# Altium schematic symbol library Regulator_Switching.SchLib: 1120 symbols (part 5 of 8)
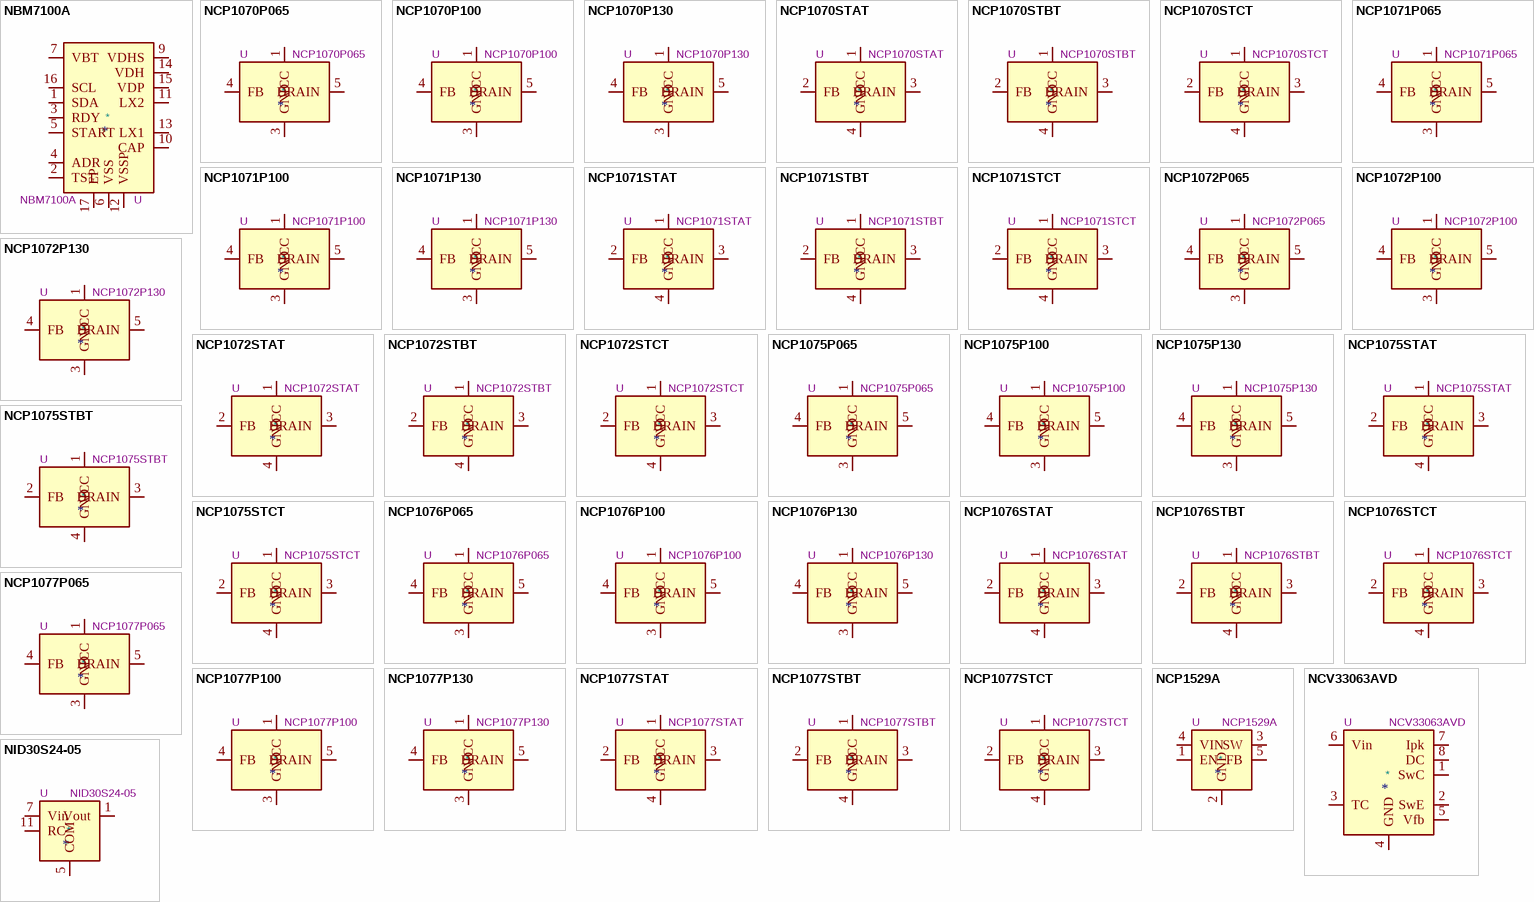
[diagram p31: symbols NBM7100A to NID30S24-05]

## NCP1071P100
designator *  value NCP1071P100  Reference: U
ki_keywords: SMPS Converter; ki_description: High-Voltage Switcher for Low Power Offline SMPS, 700V Vds, 14W/7.75W, 230V/85-265V, 100kHz, 22Ohm Rds(on), 350mA Ipk, DIP-7; ki_fp_filters: DIP*N7*W7.62mm*; Footprint: Package_DIP:DIP-8-N7_W7.62mm; Datasheet: http://www.onsemi.com/pub/Collateral/NCP1070-D.PDF
pins: 1 VCC, 2 NC hidden, 3 GND, 4 FB, 5 DRAIN, 7 GND hidden, 8 GND hidden

## NCP1071P130
designator *  value NCP1071P130  Reference: U
ki_keywords: SMPS Converter; ki_description: High-Voltage Switcher for Low Power Offline SMPS, 700V Vds, 14W/7.75W, 230V/85-265V, 130kHz, 22Ohm Rds(on), 350mA Ipk, DIP-7; ki_fp_filters: DIP*N7*W7.62mm*; Footprint: Package_DIP:DIP-8-N7_W7.62mm; Datasheet: http://www.onsemi.com/pub/Collateral/NCP1070-D.PDF
pins: 1 VCC, 2 NC hidden, 3 GND, 4 FB, 5 DRAIN, 7 GND hidden, 8 GND hidden

## NCP1071STAT
designator *  value NCP1071STAT  Reference: U
ki_keywords: SMPS Converter; ki_description: High-Voltage Switcher for Low Power Offline SMPS, 700V Vds, 14W/7.75W, 230V/85-265V, 65kHz, 22Ohm Rds(on), 350mA Ipk, SOT-223; ki_fp_filters: SOT?223*; Footprint: Package_TO_SOT_SMD:SOT-223; Datasheet: http://www.onsemi.com/pub/Collateral/NCP1070-D.PDF
pins: 1 VCC, 2 FB, 3 DRAIN, 4 GND

## NCP1071STBT
designator *  value NCP1071STBT  Reference: U
ki_keywords: SMPS Converter; ki_description: High-Voltage Switcher for Low Power Offline SMPS, 700V Vds, 14W/7.75W, 230V/85-265V, 100kHz, 22Ohm Rds(on), 350mA Ipk, SOT-223; ki_fp_filters: SOT?223*; Footprint: Package_TO_SOT_SMD:SOT-223; Datasheet: http://www.onsemi.com/pub/Collateral/NCP1070-D.PDF
pins: 1 VCC, 2 FB, 3 DRAIN, 4 GND

## NCP1071STCT
designator *  value NCP1071STCT  Reference: U
ki_keywords: SMPS Converter; ki_description: High-Voltage Switcher for Low Power Offline SMPS, 700V Vds, 14W/7.75W, 230V/85-265V, 130kHz, 22Ohm Rds(on), 350mA Ipk, SOT-223; ki_fp_filters: SOT?223*; Footprint: Package_TO_SOT_SMD:SOT-223; Datasheet: http://www.onsemi.com/pub/Collateral/NCP1070-D.PDF
pins: 1 VCC, 2 FB, 3 DRAIN, 4 GND

## NCP1072P065
designator *  value NCP1072P065  Reference: U
ki_keywords: SMPS Converter; ki_description: High-Voltage Switcher for Low Power Offline SMPS, 700V Vds, 19W/10W, 230V/85-265V, 65kHz, 11Ohm Rds(on), 250mA Ipk, DIP-7; ki_fp_filters: DIP*N7*W7.62mm*; Footprint: Package_DIP:DIP-8-N7_W7.62mm; Datasheet: http://www.onsemi.com/pub/Collateral/NCP1070-D.PDF
pins: 1 VCC, 2 NC hidden, 3 GND, 4 FB, 5 DRAIN, 7 GND hidden, 8 GND hidden

## NCP1072P100
designator *  value NCP1072P100  Reference: U
ki_keywords: SMPS Converter; ki_description: High-Voltage Switcher for Low Power Offline SMPS, 700V Vds, 19W/10W, 230V/85-265V, 100kHz, 11Ohm Rds(on), 250mA Ipk, DIP-7; ki_fp_filters: DIP*N7*W7.62mm*; Footprint: Package_DIP:DIP-8-N7_W7.62mm; Datasheet: http://www.onsemi.com/pub/Collateral/NCP1070-D.PDF
pins: 1 VCC, 2 NC hidden, 3 GND, 4 FB, 5 DRAIN, 7 GND hidden, 8 GND hidden

## NCP1072P130
designator *  value NCP1072P130  Reference: U
ki_keywords: SMPS Converter; ki_description: High-Voltage Switcher for Low Power Offline SMPS, 700V Vds, 19W/10W, 230V/85-265V, 130kHz, 11Ohm Rds(on), 250mA Ipk, DIP-7; ki_fp_filters: DIP*N7*W7.62mm*; Footprint: Package_DIP:DIP-8-N7_W7.62mm; Datasheet: http://www.onsemi.com/pub/Collateral/NCP1070-D.PDF
pins: 1 VCC, 2 NC hidden, 3 GND, 4 FB, 5 DRAIN, 7 GND hidden, 8 GND hidden

## NCP1072STAT
designator *  value NCP1072STAT  Reference: U
ki_keywords: SMPS Converter; ki_description: High-Voltage Switcher for Low Power Offline SMPS, 700V Vds, 19W/10W, 230V/85-265V, 65kHz, 11Ohm Rds(on), 250mA Ipk, SOT-223; ki_fp_filters: SOT?223*; Footprint: Package_TO_SOT_SMD:SOT-223; Datasheet: http://www.onsemi.com/pub/Collateral/NCP1070-D.PDF
pins: 1 VCC, 2 FB, 3 DRAIN, 4 GND

## NCP1072STBT
designator *  value NCP1072STBT  Reference: U
ki_keywords: SMPS Converter; ki_description: High-Voltage Switcher for Low Power Offline SMPS, 700V Vds, 19W/10W, 230V/85-265V, 100kHz, 11Ohm Rds(on), 250mA Ipk, SOT-223; ki_fp_filters: SOT?223*; Footprint: Package_TO_SOT_SMD:SOT-223; Datasheet: http://www.onsemi.com/pub/Collateral/NCP1070-D.PDF
pins: 1 VCC, 2 FB, 3 DRAIN, 4 GND

## NCP1072STCT
designator *  value NCP1072STCT  Reference: U
ki_keywords: SMPS Converter; ki_description: High-Voltage Switcher for Low Power Offline SMPS, 700V Vds, 19W/10W, 230V/85-265V, 130kHz, 11Ohm Rds(on), 250mA Ipk, SOT-223; ki_fp_filters: SOT?223*; Footprint: Package_TO_SOT_SMD:SOT-223; Datasheet: http://www.onsemi.com/pub/Collateral/NCP1070-D.PDF
pins: 1 VCC, 2 FB, 3 DRAIN, 4 GND

## NCP1075P065
designator *  value NCP1075P065  Reference: U
ki_keywords: SMPS Converter; ki_description: High-Voltage Switcher for Low Power Offline SMPS, 700V Vds, 19W/10W, 230V/85-265V, 65kHz, 11Ohm Rds(on), 450mA Ipk, DIP-7; ki_fp_filters: DIP*N7*W7.62mm*; Footprint: Package_DIP:DIP-8-N7_W7.62mm; Datasheet: http://www.onsemi.com/pub/Collateral/NCP1070-D.PDF
pins: 1 VCC, 2 NC hidden, 3 GND, 4 FB, 5 DRAIN, 7 GND hidden, 8 GND hidden

## NCP1075P100
designator *  value NCP1075P100  Reference: U
ki_keywords: SMPS Converter; ki_description: High-Voltage Switcher for Low Power Offline SMPS, 700V Vds, 19W/10W, 230V/85-265V, 100kHz, 11Ohm Rds(on), 450mA Ipk, DIP-7; ki_fp_filters: DIP*N7*W7.62mm*; Footprint: Package_DIP:DIP-8-N7_W7.62mm; Datasheet: http://www.onsemi.com/pub/Collateral/NCP1070-D.PDF
pins: 1 VCC, 2 NC hidden, 3 GND, 4 FB, 5 DRAIN, 7 GND hidden, 8 GND hidden

## NCP1075P130
designator *  value NCP1075P130  Reference: U
ki_keywords: SMPS Converter; ki_description: High-Voltage Switcher for Low Power Offline SMPS, 700V Vds, 19W/10W, 230V/85-265V, 130kHz, 11Ohm Rds(on), 450mA Ipk, DIP-7; ki_fp_filters: DIP*N7*W7.62mm*; Footprint: Package_DIP:DIP-8-N7_W7.62mm; Datasheet: http://www.onsemi.com/pub/Collateral/NCP1070-D.PDF
pins: 1 VCC, 2 NC hidden, 3 GND, 4 FB, 5 DRAIN, 7 GND hidden, 8 GND hidden

## NCP1075STAT
designator *  value NCP1075STAT  Reference: U
ki_keywords: SMPS Converter; ki_description: High-Voltage Switcher for Low Power Offline SMPS, 700V Vds, 19W/10W, 230V/85-265V, 65kHz, 11Ohm Rds(on), 450mA Ipk, SOT-223; ki_fp_filters: SOT?223*; Footprint: Package_TO_SOT_SMD:SOT-223; Datasheet: http://www.onsemi.com/pub/Collateral/NCP1070-D.PDF
pins: 1 VCC, 2 FB, 3 DRAIN, 4 GND

## NCP1075STBT
designator *  value NCP1075STBT  Reference: U
ki_keywords: SMPS Converter; ki_description: High-Voltage Switcher for Low Power Offline SMPS, 700V Vds, 19W/10W, 230V/85-265V, 100kHz, 11Ohm Rds(on), 450mA Ipk, SOT-223; ki_fp_filters: SOT?223*; Footprint: Package_TO_SOT_SMD:SOT-223; Datasheet: http://www.onsemi.com/pub/Collateral/NCP1070-D.PDF
pins: 1 VCC, 2 FB, 3 DRAIN, 4 GND

## NCP1075STCT
designator *  value NCP1075STCT  Reference: U
ki_keywords: SMPS Converter; ki_description: High-Voltage Switcher for Low Power Offline SMPS, 700V Vds, 19W/10W, 230V/85-265V, 130kHz, 11Ohm Rds(on), 450mA Ipk, SOT-223; ki_fp_filters: SOT?223*; Footprint: Package_TO_SOT_SMD:SOT-223; Datasheet: http://www.onsemi.com/pub/Collateral/NCP1070-D.PDF
pins: 1 VCC, 2 FB, 3 DRAIN, 4 GND

## NCP1076P065
designator *  value NCP1076P065  Reference: U
ki_keywords: SMPS Converter; ki_description: High-Voltage Switcher for Low Power Offline SMPS, 700V Vds, 25W/15W, 230V/85-265V, 65kHz, 4.7Ohm Rds(on), 650mA Ipk, DIP-7; ki_fp_filters: DIP*N7*W7.62mm*; Footprint: Package_DIP:DIP-8-N7_W7.62mm; Datasheet: http://www.onsemi.com/pub/Collateral/NCP1070-D.PDF
pins: 1 VCC, 2 NC hidden, 3 GND, 4 FB, 5 DRAIN, 7 GND hidden, 8 GND hidden

## NCP1076P100
designator *  value NCP1076P100  Reference: U
ki_keywords: SMPS Converter; ki_description: High-Voltage Switcher for Low Power Offline SMPS, 700V Vds, 25W/15W, 230V/85-265V, 100kHz, 4.7Ohm Rds(on), 650mA Ipk, DIP-7; ki_fp_filters: DIP*N7*W7.62mm*; Footprint: Package_DIP:DIP-8-N7_W7.62mm; Datasheet: http://www.onsemi.com/pub/Collateral/NCP1070-D.PDF
pins: 1 VCC, 2 NC hidden, 3 GND, 4 FB, 5 DRAIN, 7 GND hidden, 8 GND hidden

## NCP1076P130
designator *  value NCP1076P130  Reference: U
ki_keywords: SMPS Converter; ki_description: High-Voltage Switcher for Low Power Offline SMPS, 700V Vds, 25W/15W, 230V/85-265V, 130kHz, 4.7Ohm Rds(on), 650mA Ipk, DIP-7; ki_fp_filters: DIP*N7*W7.62mm*; Footprint: Package_DIP:DIP-8-N7_W7.62mm; Datasheet: http://www.onsemi.com/pub/Collateral/NCP1070-D.PDF
pins: 1 VCC, 2 NC hidden, 3 GND, 4 FB, 5 DRAIN, 7 GND hidden, 8 GND hidden

## NCP1076STAT
designator *  value NCP1076STAT  Reference: U
ki_keywords: SMPS Converter; ki_description: High-Voltage Switcher for Low Power Offline SMPS, 700V Vds, 25W/15W, 230V/85-265V, 65kHz, 4.7Ohm Rds(on), 650mA Ipk, SOT-223; ki_fp_filters: SOT?223*; Footprint: Package_TO_SOT_SMD:SOT-223; Datasheet: http://www.onsemi.com/pub/Collateral/NCP1070-D.PDF
pins: 1 VCC, 2 FB, 3 DRAIN, 4 GND

## NCP1076STBT
designator *  value NCP1076STBT  Reference: U
ki_keywords: SMPS Converter; ki_description: High-Voltage Switcher for Low Power Offline SMPS, 700V Vds, 25W/15W, 230V/85-265V, 100kHz, 4.7Ohm Rds(on), 650mA Ipk, SOT-223; ki_fp_filters: SOT?223*; Footprint: Package_TO_SOT_SMD:SOT-223; Datasheet: http://www.onsemi.com/pub/Collateral/NCP1070-D.PDF
pins: 1 VCC, 2 FB, 3 DRAIN, 4 GND

## NCP1076STCT
designator *  value NCP1076STCT  Reference: U
ki_keywords: SMPS Converter; ki_description: High-Voltage Switcher for Low Power Offline SMPS, 700V Vds, 25W/15W, 230V/85-265V, 130kHz, 4.7Ohm Rds(on), 650mA Ipk, SOT-223; ki_fp_filters: SOT?223*; Footprint: Package_TO_SOT_SMD:SOT-223; Datasheet: http://www.onsemi.com/pub/Collateral/NCP1070-D.PDF
pins: 1 VCC, 2 FB, 3 DRAIN, 4 GND

## NCP1077P065
designator *  value NCP1077P065  Reference: U
ki_keywords: SMPS Converter; ki_description: High-Voltage Switcher for Low Power Offline SMPS, 700V Vds, 25W/15W, 230V/85-265V, 65kHz, 4.7Ohm Rds(on), 800mA Ipk, DIP-7; ki_fp_filters: DIP*N7*W7.62mm*; Footprint: Package_DIP:DIP-8-N7_W7.62mm; Datasheet: http://www.onsemi.com/pub/Collateral/NCP1070-D.PDF
pins: 1 VCC, 2 NC hidden, 3 GND, 4 FB, 5 DRAIN, 7 GND hidden, 8 GND hidden

## NCP1077P100
designator *  value NCP1077P100  Reference: U
ki_keywords: SMPS Converter; ki_description: High-Voltage Switcher for Low Power Offline SMPS, 700V Vds, 25W/15W, 230V/85-265V, 100kHz, 4.7Ohm Rds(on), 800mA Ipk, DIP-7; ki_fp_filters: DIP*N7*W7.62mm*; Footprint: Package_DIP:DIP-8-N7_W7.62mm; Datasheet: http://www.onsemi.com/pub/Collateral/NCP1070-D.PDF
pins: 1 VCC, 2 NC hidden, 3 GND, 4 FB, 5 DRAIN, 7 GND hidden, 8 GND hidden

## NCP1077P130
designator *  value NCP1077P130  Reference: U
ki_keywords: SMPS Converter; ki_description: High-Voltage Switcher for Low Power Offline SMPS, 700V Vds, 25W/15W, 230V/85-265V, 130kHz, 4.7Ohm Rds(on), 800mA Ipk, DIP-7; ki_fp_filters: DIP*N7*W7.62mm*; Footprint: Package_DIP:DIP-8-N7_W7.62mm; Datasheet: http://www.onsemi.com/pub/Collateral/NCP1070-D.PDF
pins: 1 VCC, 2 NC hidden, 3 GND, 4 FB, 5 DRAIN, 7 GND hidden, 8 GND hidden

## NCP1077STAT
designator *  value NCP1077STAT  Reference: U
ki_keywords: SMPS Converter; ki_description: High-Voltage Switcher for Low Power Offline SMPS, 700V Vds, 25W/15W, 230V/85-265V, 65kHz, 4.7Ohm Rds(on), 800mA Ipk, SOT-223; ki_fp_filters: SOT?223*; Footprint: Package_TO_SOT_SMD:SOT-223; Datasheet: http://www.onsemi.com/pub/Collateral/NCP1070-D.PDF
pins: 1 VCC, 2 FB, 3 DRAIN, 4 GND

## NCP1077STBT
designator *  value NCP1077STBT  Reference: U
ki_keywords: SMPS Converter; ki_description: High-Voltage Switcher for Low Power Offline SMPS, 700V Vds, 25W/15W, 230V/85-265V, 100kHz, 4.7Ohm Rds(on), 800mA Ipk, SOT-223; ki_fp_filters: SOT?223*; Footprint: Package_TO_SOT_SMD:SOT-223; Datasheet: http://www.onsemi.com/pub/Collateral/NCP1070-D.PDF
pins: 1 VCC, 2 FB, 3 DRAIN, 4 GND

## NCP1077STCT
designator *  value NCP1077STCT  Reference: U
ki_keywords: SMPS Converter; ki_description: High-Voltage Switcher for Low Power Offline SMPS, 700V Vds, 25W/15W, 230V/85-265V, 130kHz, 4.7Ohm Rds(on), 800mA Ipk, SOT-223; ki_fp_filters: SOT?223*; Footprint: Package_TO_SOT_SMD:SOT-223; Datasheet: http://www.onsemi.com/pub/Collateral/NCP1070-D.PDF
pins: 1 VCC, 2 FB, 3 DRAIN, 4 GND

## NCP1529A
designator *  value NCP1529A  Reference: U
ki_keywords: Step-Down Buck DC-DC Regulator Adjustable; ki_description: 1.7MHz, 1A, High Efficiency, Low Ripple, Adjustable Output Voltage Step-down Converter, SOT-23-5; ki_fp_filters: SOT?23*; Footprint: Package_TO_SOT_SMD:SOT-23-5; Datasheet: https://www.onsemi.com/pub/Collateral/NCP1529-D.PDF
pins: 1 EN, 2 GND, 3 SW, 4 VIN, 5 FB

## NCV33063AVD
designator *  value NCV33063AVD  Reference: U
ki_keywords: smps buck boost inverting; ki_description: 1.5A, step-up/down/inverting switching regulator, 3-40V Vin, 100kHz, SO-8; ki_fp_filters: SOIC*3.9x4.9mm*P1.27mm*; Footprint: Package_SO:SOIC-8_3.9x4.9mm_P1.27mm; Datasheet: http://www.onsemi.com/pub_link/Collateral/MC34063A-D.PDF
pins: 1 SwC, 2 SwE, 3 TC, 4 GND, 5 Vfb, 6 Vin, 7 Ipk, 8 DC

## NID30S24-05
designator *  value NID30S24-05  Reference: U
ki_keywords: Step-Down Converter Module DC/DC; ki_description: 2.5A/12.5W Step Down Converter Module, fixed 5V Output Voltage, 250kHz, 20-53V Input Voltage; ki_fp_filters: Converter*DCDC*MeanWell*NID30*THT*; Footprint: Converter_DCDC:Converter_DCDC_MeanWell_NID30_THT; Datasheet: http://www.meanwell.com/webapp/product/search.aspx?prod=nid30
pins: 1 Vout, 2 Vout hidden, 3 Vout hidden, 4 Vout hidden, 5 COM, 6 COM hidden, 7 Vin, 8 Vin hidden, 9 NC hidden, 10 NC hidden, 11 RC

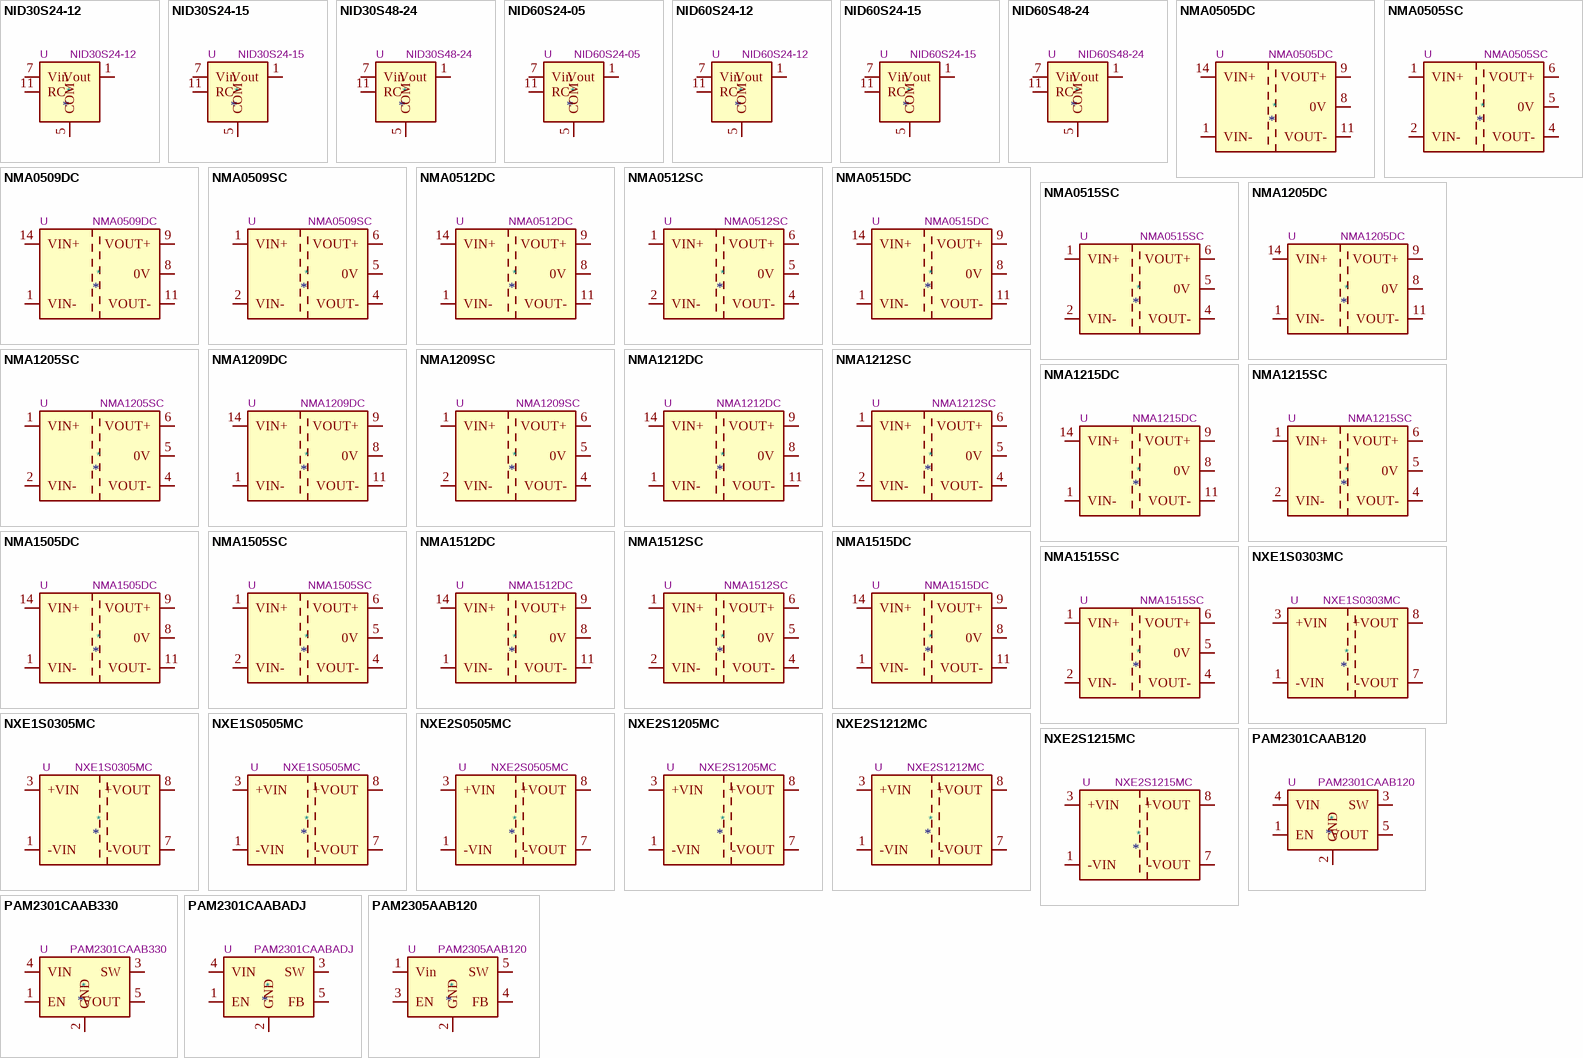
[diagram p16: symbols NID30S24-12 to PAM2305AAB120]

## NID30S24-12
designator *  value NID30S24-12  Reference: U
ki_keywords: Step-Down Converter Module DC/DC; ki_description: 2.5A/30W Step Down Converter Module, fixed 12V Output Voltage, 250kHz, 20-53V Input Voltage; ki_fp_filters: Converter*DCDC*MeanWell*NID30*THT*; Footprint: Converter_DCDC:Converter_DCDC_MeanWell_NID30_THT; Datasheet: http://www.meanwell.com/webapp/product/search.aspx?prod=nid30
pins: 1 Vout, 2 Vout hidden, 3 Vout hidden, 4 Vout hidden, 5 COM, 6 COM hidden, 7 Vin, 8 Vin hidden, 9 NC hidden, 10 NC hidden, 11 RC

## NID30S24-15
designator *  value NID30S24-15  Reference: U
ki_keywords: Step-Down Converter Module DC/DC; ki_description: 2.5A/30W Step Down Converter Module, fixed 15V Output Voltage, 250kHz, 20-53V Input Voltage; ki_fp_filters: Converter*DCDC*MeanWell*NID30*THT*; Footprint: Converter_DCDC:Converter_DCDC_MeanWell_NID30_THT; Datasheet: http://www.meanwell.com/webapp/product/search.aspx?prod=nid30
pins: 1 Vout, 2 Vout hidden, 3 Vout hidden, 4 Vout hidden, 5 COM, 6 COM hidden, 7 Vin, 8 Vin hidden, 9 NC hidden, 10 NC hidden, 11 RC

## NID30S48-24
designator *  value NID30S48-24  Reference: U
ki_keywords: Step-Down Converter Module DC/DC; ki_description: 1.25A/30W Step Down Converter Module, fixed 24V Output Voltage, 250kHz, 30-53V Input Voltage; ki_fp_filters: Converter*DCDC*MeanWell*NID30*THT*; Footprint: Converter_DCDC:Converter_DCDC_MeanWell_NID30_THT; Datasheet: http://www.meanwell.com/webapp/product/search.aspx?prod=nid30
pins: 1 Vout, 2 Vout hidden, 3 Vout hidden, 4 Vout hidden, 5 COM, 6 COM hidden, 7 Vin, 8 Vin hidden, 9 NC hidden, 10 NC hidden, 11 RC

## NID60S24-05
designator *  value NID60S24-05  Reference: U
ki_keywords: Step-Down Converter Module DC/DC; ki_description: 4A/20W Step Down Converter Module, fixed 5V Output Voltage, 250kHz, 20-53V Input Voltage; ki_fp_filters: Converter*DCDC*MeanWell*NID60*; Footprint: Converter_DCDC:Converter_DCDC_MeanWell_NID60_THT; Datasheet: http://www.meanwell.com/78ddf876-a86c-4a52-8a41-4ee24dd9913d
pins: 1 Vout, 2 Vout hidden, 3 Vout hidden, 4 Vout hidden, 5 COM, 6 COM hidden, 7 Vin, 8 Vin hidden, 9 NC hidden, 10 NC hidden, 11 RC

## NID60S24-12
designator *  value NID60S24-12  Reference: U
ki_keywords: Step-Down Converter Module DC/DC; ki_description: 4A/48W Step Down Converter Module, fixed 12V Output Voltage, 250kHz, 20-53V Input Voltage; ki_fp_filters: Converter*DCDC*MeanWell*NID60*; Footprint: Converter_DCDC:Converter_DCDC_MeanWell_NID60_THT; Datasheet: http://www.meanwell.com/78ddf876-a86c-4a52-8a41-4ee24dd9913d
pins: 1 Vout, 2 Vout hidden, 3 Vout hidden, 4 Vout hidden, 5 COM, 6 COM hidden, 7 Vin, 8 Vin hidden, 9 NC hidden, 10 NC hidden, 11 RC

## NID60S24-15
designator *  value NID60S24-15  Reference: U
ki_keywords: Step-Down Converter Module DC/DC; ki_description: 4A/60W Step Down Converter Module, fixed 15V Output Voltage, 250kHz, 20-53V Input Voltage; ki_fp_filters: Converter*DCDC*MeanWell*NID60*; Footprint: Converter_DCDC:Converter_DCDC_MeanWell_NID60_THT; Datasheet: http://www.meanwell.com/78ddf876-a86c-4a52-8a41-4ee24dd9913d
pins: 1 Vout, 2 Vout hidden, 3 Vout hidden, 4 Vout hidden, 5 COM, 6 COM hidden, 7 Vin, 8 Vin hidden, 9 NC hidden, 10 NC hidden, 11 RC

## NID60S48-24
designator *  value NID60S48-24  Reference: U
ki_keywords: Step-Down Converter Module DC/DC; ki_description: 2.5A/60W Step Down Converter Module, fixed 24V Output Voltage, 250kHz, 30-53V Input Voltage; ki_fp_filters: Converter*DCDC*MeanWell*NID60*; Footprint: Converter_DCDC:Converter_DCDC_MeanWell_NID60_THT; Datasheet: http://www.meanwell.com/78ddf876-a86c-4a52-8a41-4ee24dd9913d
pins: 1 Vout, 2 Vout hidden, 3 Vout hidden, 4 Vout hidden, 5 COM, 6 COM hidden, 7 Vin, 8 Vin hidden, 9 NC hidden, 10 NC hidden, 11 RC

## NMA0505DC
designator *  value NMA0505DC  Reference: U
ki_keywords: Murata isolated isolation dc-dc converter; ki_description: +/-100mA Isolated 1W Dual output DC/DC Converter, 5V Input Voltage, +/-5V Output Voltage, DIP Package; ki_fp_filters: Converter*DCDC*Murata*NMAxxxxDC*; Footprint: Converter_DCDC:Converter_DCDC_Murata_NMAxxxxDC_THT; Datasheet: http://power.murata.com/data/power/ncl/kdc_nma.pdf
pins: 1 VIN-, 7 NC hidden, 8 0V, 9 VOUT+, 11 VOUT-, 14 VIN+

## NMA0505SC
designator *  value NMA0505SC  Reference: U
ki_keywords: Murata isolated isolation dc-dc converter; ki_description: +/-100mA Isolated 1W Dual output DC/DC Converter Module, 5V Input Voltage, +/-5V Output Voltage, SIP3; ki_fp_filters: Converter*DCDC*Murata*NMAxxxxSC*; Footprint: Converter_DCDC:Converter_DCDC_Murata_NMAxxxxSC_THT; Datasheet: http://power.murata.com/data/power/ncl/kdc_nma.pdf
pins: 1 VIN+, 2 VIN-, 4 VOUT-, 5 0V, 6 VOUT+

## NMA0509DC
designator *  value NMA0509DC  Reference: U
ki_keywords: Murata isolated isolation dc-dc converter; ki_description: +/-55mA Isolated 1W Dual output DC/DC Converter Module, 5V Input Voltage, +/-9V Output Voltage, DIP Package; ki_fp_filters: Converter*DCDC*Murata*NMAxxxxDC*; Footprint: Converter_DCDC:Converter_DCDC_Murata_NMAxxxxDC_THT; Datasheet: http://power.murata.com/data/power/ncl/kdc_nma.pdf
pins: 1 VIN-, 7 NC hidden, 8 0V, 9 VOUT+, 11 VOUT-, 14 VIN+

## NMA0509SC
designator *  value NMA0509SC  Reference: U
ki_keywords: Murata isolated isolation dc-dc converter; ki_description: +/-55mA Isolated 1W Dual output DC/DC Converter Module, 5V Input Voltage, +/-9V Output Voltage, SIP3; ki_fp_filters: Converter*DCDC*Murata*NMAxxxxSC*; Footprint: Converter_DCDC:Converter_DCDC_Murata_NMAxxxxSC_THT; Datasheet: http://power.murata.com/data/power/ncl/kdc_nma.pdf
pins: 1 VIN+, 2 VIN-, 4 VOUT-, 5 0V, 6 VOUT+

## NMA0512DC
designator *  value NMA0512DC  Reference: U
ki_keywords: Murata isolated isolation dc-dc converter; ki_description: +/-42mA Isolated 1W Dual output DC/DC Converter Module, 5V Input Voltage, +/-12V Output Voltage, DIP Package; ki_fp_filters: Converter*DCDC*Murata*NMAxxxxDC*; Footprint: Converter_DCDC:Converter_DCDC_Murata_NMAxxxxDC_THT; Datasheet: http://power.murata.com/data/power/ncl/kdc_nma.pdf
pins: 1 VIN-, 7 NC hidden, 8 0V, 9 VOUT+, 11 VOUT-, 14 VIN+

## NMA0512SC
designator *  value NMA0512SC  Reference: U
ki_keywords: Murata isolated isolation dc-dc converter; ki_description: +/-42mA Isolated 1W Dual output DC/DC Converter Module, 5V Input Voltage, +/-12V Output Voltage, SIP3; ki_fp_filters: Converter*DCDC*Murata*NMAxxxxSC*; Footprint: Converter_DCDC:Converter_DCDC_Murata_NMAxxxxSC_THT; Datasheet: http://power.murata.com/data/power/ncl/kdc_nma.pdf
pins: 1 VIN+, 2 VIN-, 4 VOUT-, 5 0V, 6 VOUT+

## NMA0515DC
designator *  value NMA0515DC  Reference: U
ki_keywords: Murata isolated isolation dc-dc converter; ki_description: +/-33mA Isolated 1W Dual output DC/DC Converter Module, 5V Input Voltage, +/-15V Output Voltage, DIP Package; ki_fp_filters: Converter*DCDC*Murata*NMAxxxxDC*; Footprint: Converter_DCDC:Converter_DCDC_Murata_NMAxxxxDC_THT; Datasheet: http://power.murata.com/data/power/ncl/kdc_nma.pdf
pins: 1 VIN-, 7 NC hidden, 8 0V, 9 VOUT+, 11 VOUT-, 14 VIN+

## NMA0515SC
designator *  value NMA0515SC  Reference: U
ki_keywords: Murata isolated isolation dc-dc converter; ki_description: +/-33mA Isolated 1W Dual output DC/DC Converter Module, 5V Input Voltage, +/-15V Output Voltage, SIP3; ki_fp_filters: Converter*DCDC*Murata*NMAxxxxSC*; Footprint: Converter_DCDC:Converter_DCDC_Murata_NMAxxxxSC_THT; Datasheet: http://power.murata.com/data/power/ncl/kdc_nma.pdf
pins: 1 VIN+, 2 VIN-, 4 VOUT-, 5 0V, 6 VOUT+

## NMA1205DC
designator *  value NMA1205DC  Reference: U
ki_keywords: Murata isolated isolation dc-dc converter; ki_description: +/-100mA Isolated 1W Dual output DC/DC Converter Module, 12V Input Voltage, +/-5V Output Voltage, DIP Package; ki_fp_filters: Converter*DCDC*Murata*NMAxxxxDC*; Footprint: Converter_DCDC:Converter_DCDC_Murata_NMAxxxxDC_THT; Datasheet: http://power.murata.com/data/power/ncl/kdc_nma.pdf
pins: 1 VIN-, 7 NC hidden, 8 0V, 9 VOUT+, 11 VOUT-, 14 VIN+

## NMA1205SC
designator *  value NMA1205SC  Reference: U
ki_keywords: Murata isolated isolation dc-dc converter; ki_description: +/-100mA Isolated 1W Dual output DC/DC Converter Module, 12V Input Voltage, +/-5V Output Voltage, SIP3; ki_fp_filters: Converter*DCDC*Murata*NMAxxxxSC*; Footprint: Converter_DCDC:Converter_DCDC_Murata_NMAxxxxSC_THT; Datasheet: http://power.murata.com/data/power/ncl/kdc_nma.pdf
pins: 1 VIN+, 2 VIN-, 4 VOUT-, 5 0V, 6 VOUT+

## NMA1209DC
designator *  value NMA1209DC  Reference: U
ki_keywords: Murata isolated isolation dc-dc converter; ki_description: +/-55mA Isolated 1W Dual output DC/DC Converter Module, 12V Input Voltage, +/-9V Output Voltage, DIP Package; ki_fp_filters: Converter*DCDC*Murata*NMAxxxxDC*; Footprint: Converter_DCDC:Converter_DCDC_Murata_NMAxxxxDC_THT; Datasheet: http://power.murata.com/data/power/ncl/kdc_nma.pdf
pins: 1 VIN-, 7 NC hidden, 8 0V, 9 VOUT+, 11 VOUT-, 14 VIN+

## NMA1209SC
designator *  value NMA1209SC  Reference: U
ki_keywords: Murata isolated isolation dc-dc converter; ki_description: +/-55mA Isolated 1W Dual output DC/DC Converter Module, 12V Input Voltage, +/-9V Output Voltage, SIP3; ki_fp_filters: Converter*DCDC*Murata*NMAxxxxSC*; Footprint: Converter_DCDC:Converter_DCDC_Murata_NMAxxxxSC_THT; Datasheet: http://power.murata.com/data/power/ncl/kdc_nma.pdf
pins: 1 VIN+, 2 VIN-, 4 VOUT-, 5 0V, 6 VOUT+

## NMA1212DC
designator *  value NMA1212DC  Reference: U
ki_keywords: Murata isolated isolation dc-dc converter; ki_description: +/-42mA Isolated 1W Dual output DC/DC Converter Module, 12V Input Voltage, +/-12V Output Voltage, DIP Package; ki_fp_filters: Converter*DCDC*Murata*NMAxxxxDC*; Footprint: Converter_DCDC:Converter_DCDC_Murata_NMAxxxxDC_THT; Datasheet: http://power.murata.com/data/power/ncl/kdc_nma.pdf
pins: 1 VIN-, 7 NC hidden, 8 0V, 9 VOUT+, 11 VOUT-, 14 VIN+

## NMA1212SC
designator *  value NMA1212SC  Reference: U
ki_keywords: Murata isolated isolation dc-dc converter; ki_description: +/-42mA Isolated 1W Dual output DC/DC Converter Module, 12V Input Voltage, +/-12V Output Voltage, SIP3; ki_fp_filters: Converter*DCDC*Murata*NMAxxxxSC*; Footprint: Converter_DCDC:Converter_DCDC_Murata_NMAxxxxSC_THT; Datasheet: http://power.murata.com/data/power/ncl/kdc_nma.pdf
pins: 1 VIN+, 2 VIN-, 4 VOUT-, 5 0V, 6 VOUT+

## NMA1215DC
designator *  value NMA1215DC  Reference: U
ki_keywords: Murata isolated isolation dc-dc converter; ki_description: +/-33mA Isolated 1W Dual output DC/DC Converter Module, 12V Input Voltage, +/-15V Output Voltage, DIP Package; ki_fp_filters: Converter*DCDC*Murata*NMAxxxxDC*; Footprint: Converter_DCDC:Converter_DCDC_Murata_NMAxxxxDC_THT; Datasheet: http://power.murata.com/data/power/ncl/kdc_nma.pdf
pins: 1 VIN-, 7 NC hidden, 8 0V, 9 VOUT+, 11 VOUT-, 14 VIN+

## NMA1215SC
designator *  value NMA1215SC  Reference: U
ki_keywords: Murata isolated isolation dc-dc converter; ki_description: +/-33mA Isolated 1W Dual output DC/DC Converter Module, 12V Input Voltage, +/-15V Output Voltage, SIP3; ki_fp_filters: Converter*DCDC*Murata*NMAxxxxSC*; Footprint: Converter_DCDC:Converter_DCDC_Murata_NMAxxxxSC_THT; Datasheet: http://power.murata.com/data/power/ncl/kdc_nma.pdf
pins: 1 VIN+, 2 VIN-, 4 VOUT-, 5 0V, 6 VOUT+

## NMA1505DC
designator *  value NMA1505DC  Reference: U
ki_keywords: Murata isolated isolation dc-dc converter; ki_description: +/-100mA Isolated 1W Dual output DC/DC Converter Module, 15V Input Voltage, +/-5V Output Voltage, DIP Package; ki_fp_filters: Converter*DCDC*Murata*NMAxxxxDC*; Footprint: Converter_DCDC:Converter_DCDC_Murata_NMAxxxxDC_THT; Datasheet: http://power.murata.com/data/power/ncl/kdc_nma.pdf
pins: 1 VIN-, 7 NC hidden, 8 0V, 9 VOUT+, 11 VOUT-, 14 VIN+

## NMA1505SC
designator *  value NMA1505SC  Reference: U
ki_keywords: Murata isolated isolation dc-dc converter; ki_description: +/-100mA Isolated 1W Dual output DC/DC Converter Module, 15V Input Voltage, +/-5V Output Voltage, SIP3; ki_fp_filters: Converter*DCDC*Murata*NMAxxxxSC*; Footprint: Converter_DCDC:Converter_DCDC_Murata_NMAxxxxSC_THT; Datasheet: http://power.murata.com/data/power/ncl/kdc_nma.pdf
pins: 1 VIN+, 2 VIN-, 4 VOUT-, 5 0V, 6 VOUT+

## NMA1512DC
designator *  value NMA1512DC  Reference: U
ki_keywords: Murata isolated isolation dc-dc converter; ki_description: +/-42mA Isolated 1W Dual output DC/DC Converter Module, 15V Input Voltage, +/-12V Output Voltage, DIP Package; ki_fp_filters: Converter*DCDC*Murata*NMAxxxxDC*; Footprint: Converter_DCDC:Converter_DCDC_Murata_NMAxxxxDC_THT; Datasheet: http://power.murata.com/data/power/ncl/kdc_nma.pdf
pins: 1 VIN-, 7 NC hidden, 8 0V, 9 VOUT+, 11 VOUT-, 14 VIN+

## NMA1512SC
designator *  value NMA1512SC  Reference: U
ki_keywords: Murata isolated isolation dc-dc converter; ki_description: +/-42mA Isolated 1W Dual output DC/DC Converter Module, 15V Input Voltage, +/-12V Output Voltage, SIP3; ki_fp_filters: Converter*DCDC*Murata*NMAxxxxSC*; Footprint: Converter_DCDC:Converter_DCDC_Murata_NMAxxxxSC_THT; Datasheet: http://power.murata.com/data/power/ncl/kdc_nma.pdf
pins: 1 VIN+, 2 VIN-, 4 VOUT-, 5 0V, 6 VOUT+

## NMA1515DC
designator *  value NMA1515DC  Reference: U
ki_keywords: Murata isolated isolation dc-dc converter; ki_description: +/-33mA Isolated 1W Dual output DC/DC Converter Module, 5V Input Voltage, +/-15V Output Voltage, DIP Package; ki_fp_filters: Converter*DCDC*Murata*NMAxxxxDC*; Footprint: Converter_DCDC:Converter_DCDC_Murata_NMAxxxxDC_THT; Datasheet: http://power.murata.com/data/power/ncl/kdc_nma.pdf
pins: 1 VIN-, 7 NC hidden, 8 0V, 9 VOUT+, 11 VOUT-, 14 VIN+

## NMA1515SC
designator *  value NMA1515SC  Reference: U
ki_keywords: Murata isolated isolation dc-dc converter; ki_description: +/-33mA Isolated 1W Dual output DC/DC Converter Module, 5V Input Voltage, +/-15V Output Voltage, SIP3; ki_fp_filters: Converter*DCDC*Murata*NMAxxxxSC*; Footprint: Converter_DCDC:Converter_DCDC_Murata_NMAxxxxSC_THT; Datasheet: http://power.murata.com/data/power/ncl/kdc_nma.pdf
pins: 1 VIN+, 2 VIN-, 4 VOUT-, 5 0V, 6 VOUT+

## NXE1S0303MC
designator *  value NXE1S0303MC  Reference: U
ki_keywords: isolated isolation dc-dc converter transformer; ki_description: 1W 3.3V to 3.3V 303mA DC-DC Converter with 3kV isolation; ki_fp_filters: Converter*DCDC*Murata*NXExSxxxxMC*; Footprint: Converter_DCDC:Converter_DCDC_Murata_NXExSxxxxMC_SMD; Datasheet: https://www.murata.com/products/productdata/8807031865374/kdc-nxe1.pdf
pins: 1 -VIN, 3 +VIN, 7 -VOUT, 8 +VOUT, 14 NC hidden

## NXE1S0305MC
designator *  value NXE1S0305MC  Reference: U
ki_keywords: isolated isolation dc-dc converter transformer; ki_description: 1W 3.3V to 5V 200mA DC-DC Converter with 3kV isolation; ki_fp_filters: Converter*DCDC*Murata*NXExSxxxxMC*; Footprint: Converter_DCDC:Converter_DCDC_Murata_NXExSxxxxMC_SMD; Datasheet: https://www.murata.com/products/productdata/8807031865374/kdc-nxe1.pdf
pins: 1 -VIN, 3 +VIN, 7 -VOUT, 8 +VOUT, 14 NC hidden

## NXE1S0505MC
designator *  value NXE1S0505MC  Reference: U
ki_keywords: isolated isolation dc-dc converter transformer; ki_description: 1W 5V to 5V 200mA DC-DC Converter with 3kV isolation; ki_fp_filters: Converter*DCDC*Murata*NXExSxxxxMC*; Footprint: Converter_DCDC:Converter_DCDC_Murata_NXExSxxxxMC_SMD; Datasheet: https://www.murata.com/products/productdata/8807031865374/kdc-nxe1.pdf
pins: 1 -VIN, 3 +VIN, 7 -VOUT, 8 +VOUT, 14 NC hidden

## NXE2S0505MC
designator *  value NXE2S0505MC  Reference: U
ki_keywords: isolated isolation dc-dc converter transformer; ki_description: 2W 5V to 5V 400mA DC-DC Converter with 3kV isolation; ki_fp_filters: Converter*DCDC*Murata*NXExSxxxxMC*; Footprint: Converter_DCDC:Converter_DCDC_Murata_NXExSxxxxMC_SMD; Datasheet: https://www.murata.com/products/productdata/8807031898142/kdc-nxe2.pdf
pins: 1 -VIN, 3 +VIN, 7 -VOUT, 8 +VOUT, 14 NC hidden

## NXE2S1205MC
designator *  value NXE2S1205MC  Reference: U
ki_keywords: isolated isolation dc-dc converter transformer; ki_description: 2W 12V to 5V 400mA DC-DC Converter with 3kV isolation; ki_fp_filters: Converter*DCDC*Murata*NXExSxxxxMC*; Footprint: Converter_DCDC:Converter_DCDC_Murata_NXExSxxxxMC_SMD; Datasheet: https://www.murata.com/products/productdata/8807031898142/kdc-nxe2.pdf
pins: 1 -VIN, 3 +VIN, 7 -VOUT, 8 +VOUT, 14 NC hidden

## NXE2S1212MC
designator *  value NXE2S1212MC  Reference: U
ki_keywords: isolated isolation dc-dc converter transformer; ki_description: 2W 12V to 12V 400mA DC-DC Converter with 3kV isolation; ki_fp_filters: Converter*DCDC*Murata*NXExSxxxxMC*; Footprint: Converter_DCDC:Converter_DCDC_Murata_NXExSxxxxMC_SMD; Datasheet: https://www.murata.com/products/productdata/8807031898142/kdc-nxe2.pdf
pins: 1 -VIN, 3 +VIN, 7 -VOUT, 8 +VOUT, 14 NC hidden

## NXE2S1215MC
designator *  value NXE2S1215MC  Reference: U
ki_keywords: isolated isolation dc-dc converter transformer; ki_description: 2W 12V to 15V 400mA DC-DC Converter with 3kV isolation; ki_fp_filters: Converter*DCDC*Murata*NXExSxxxxMC*; Footprint: Converter_DCDC:Converter_DCDC_Murata_NXExSxxxxMC_SMD; Datasheet: https://www.murata.com/products/productdata/8807031898142/kdc-nxe2.pdf
pins: 1 -VIN, 3 +VIN, 7 -VOUT, 8 +VOUT, 14 NC hidden

## PAM2301CAAB120
designator *  value PAM2301CAAB120  Reference: U
ki_keywords: Voltage regulator switching buck fixed output analog; ki_description: 800mA, Step-Down DC/DC-Converter, 1.2V Fixed Output Voltage, 1.5MHz, TSOT-23-5; ki_fp_filters: TSOT?23*; Footprint: Package_TO_SOT_SMD:TSOT-23-5; Datasheet: https://www.diodes.com/assets/Datasheets/products_inactive_data/PAM2301.pdf
pins: 1 EN, 2 GND, 3 SW, 4 VIN, 5 VOUT

## PAM2301CAAB330
designator *  value PAM2301CAAB330  Reference: U
ki_keywords: Voltage regulator switching buck fixed output analog; ki_description: 800mA, Step-Down DC/DC-Converter, 3.3V Fixed Output Voltage, 1.5MHz, TSOT-23-5; ki_fp_filters: TSOT?23*; Footprint: Package_TO_SOT_SMD:TSOT-23-5; Datasheet: https://www.diodes.com/assets/Datasheets/products_inactive_data/PAM2301.pdf
pins: 1 EN, 2 GND, 3 SW, 4 VIN, 5 VOUT

## PAM2301CAABADJ
designator *  value PAM2301CAABADJ  Reference: U
ki_keywords: Voltage regulator switching buck fixed output analog; ki_description: 800mA, Step-Down DC/DC-Converter, Adjustable Output Voltage, 1.5MHz, TSOT-23-5; ki_fp_filters: TSOT?23*; Footprint: Package_TO_SOT_SMD:TSOT-23-5; Datasheet: https://www.diodes.com/assets/Datasheets/products_inactive_data/PAM2301.pdf
pins: 1 EN, 2 GND, 3 SW, 4 VIN, 5 FB

## PAM2305AAB120
designator *  value PAM2305AAB120  Reference: U
ki_keywords: Voltage regulator switching buck fixed output analog; ki_description: 1A, Step-Down DC/DC-Converter, 1.2V Fixed Output Voltage, 1.5MHz, TSOT-23; ki_fp_filters: TSOT?23*; Footprint: Package_TO_SOT_SMD:TSOT-23-5; Datasheet: https://www.diodes.com/assets/Datasheets/PAM2305.pdf
pins: 1 Vin, 2 GND, 3 EN, 4 FB, 5 SW
